# Altium footprint library Module.PcbLib: 63 footprints (part 4 of 4)
Each footprint in its own frame and in the unit in brackets; x right, y up, seen from the top. Pads: shape width x height; smd on the part's side, far side on the other; paste and mask are expansions set on the pad; w line width, h text height; cw(c..) or ccw(c..) is an arc to the next point about the centre after c.
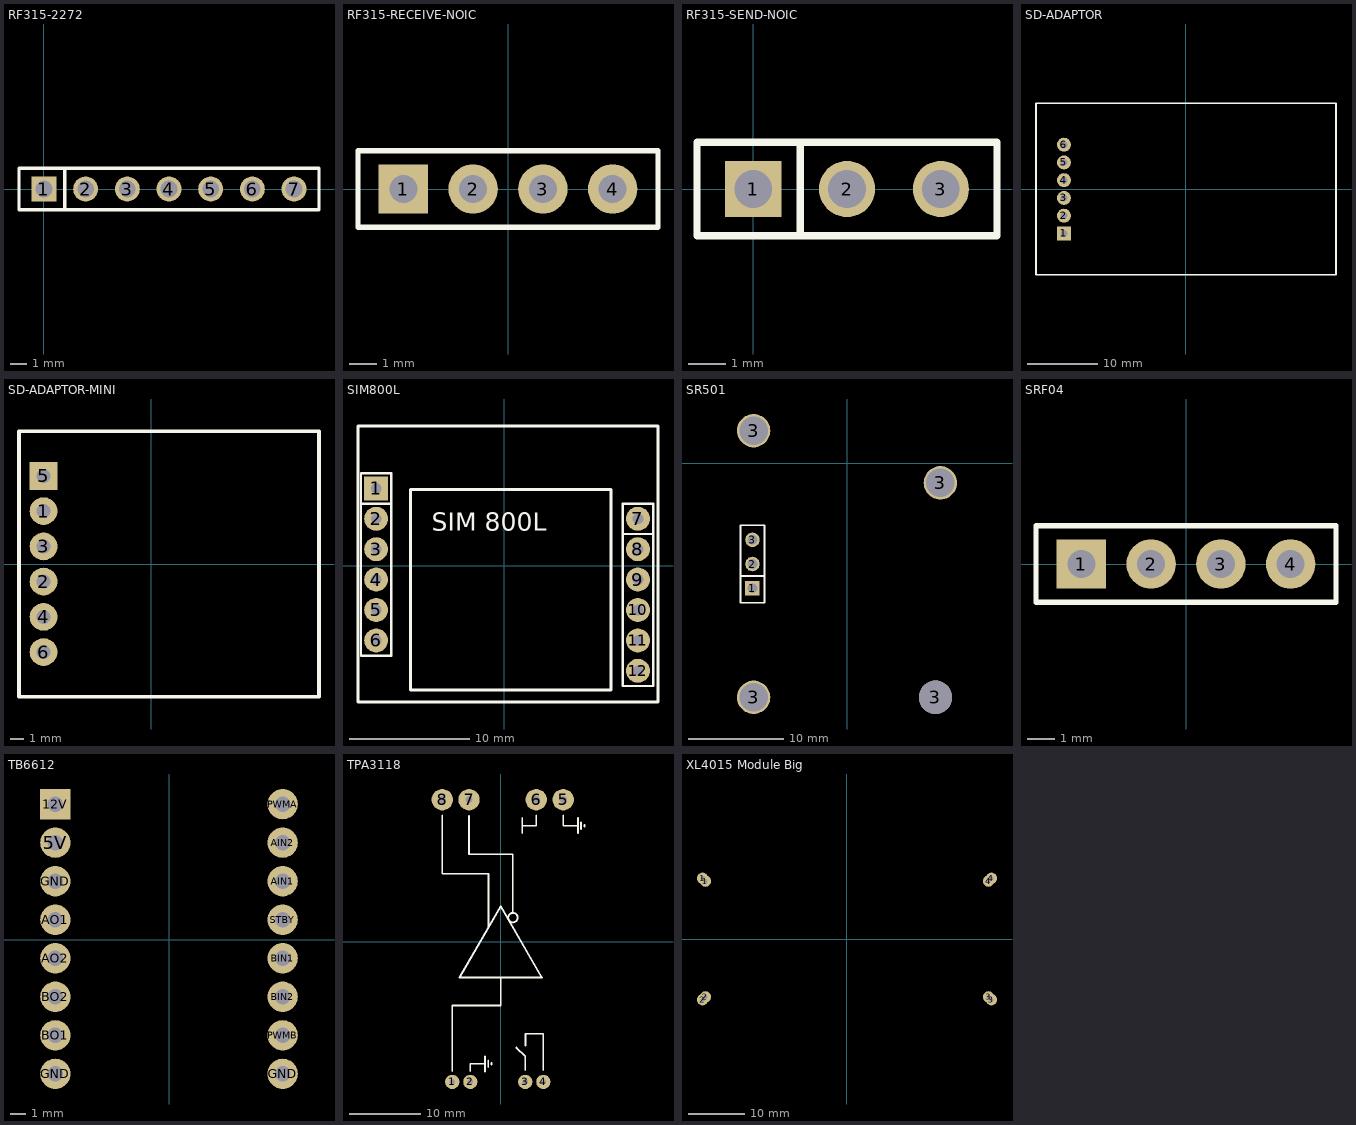
[diagram p3: the footprints below, top view; thin cyan lines are the x and y axes]

## RF315-2272 [mm]
height 8.5
pads (7):
  rect 1.52x1.52 hole 1.02: 1(0,0)
  round 1.52 hole 1.02: 2(2.54,0) 3(5.08,0) 4(7.62,0) 5(10.16,0) 6(12.7,0) 7(15.24,0)
Top Overlay:
  lines w0.2: 1.27,-1.27 1.27,1.27 ; -1.52,-1.27 -1.52,1.27 16.76,1.27 16.76,-1.27 -1.52,-1.27
3D body "61300711821.stp": height 8.51, standoff -3.09, extent -1.52,-1.25 16.76,1.25
3D body "User Library-XY_DJM_5V_RECEPTOR.STEP": height 30.31, standoff 2.31, extent -24.363,-1.468 16.637,5.532

## RF315-RECEIVE-NOIC [mm]
height 8.5
pads (4):
  rect 1.8x1.8 hole 1.02: 1(-3.81,0)
  round 1.8 hole 1.02: 2(-1.27,0) 3(1.27,0) 4(3.81,0)
Top Overlay:
  lines w0.2: -5.461,-1.397 5.461,-1.397 5.461,1.397 -5.461,1.397 -5.461,-1.397
3D body "61300411821.stp": height 8.51, standoff -3.09, extent -5.33,-1.25 5.33,1.25
3D body "User Library-XD-RF-5V.STEP": height 21.75, standoff 2.75, extent -22.366,-1.524 7.634,6.476

## RF315-SEND-NOIC [mm]
height 8.5
pads (3):
  rect 1.52x1.52 hole 1.02: 1(0,0)
  round 1.52 hole 1.02: 2(2.54,0) 3(5.08,0)
Top Overlay:
  lines w0.2: 1.27,-1.27 1.27,1.27 ; -1.524,-1.27 6.6,-1.27 6.6,1.27 -1.524,1.27 -1.524,-1.27
3D body "61300311821.stp": height 8.51, standoff -3.09, extent -1.52,-1.25 6.6,1.25
3D body "User Library-XD-FST.STEP": height 27.22, standoff 2.32, extent -7.468,-1.526 11.532,6.604

## rn4020 [mm]
height 8.5
3D body "RN4020.step": height 0.01, standoff -2.3, extent -9.271,-5.911 10.234,5.595

## SD-ADAPTOR [mm]
pads (6):
  rect 2x2 hole 1.02: 1(-17.468,-6.359)
  round 2 hole 1.02: 2(-17.468,-3.819) 3(-17.468,-1.279) 4(-17.468,1.261) 5(-17.468,3.801) 6(-17.468,6.341)
Top Overlay:
  lines w0.254: -21.467,-12.273 21.468,-12.273 21.468,12.273 -21.467,12.273 -21.467,-12.273
3D body "61300611121.stp": height 8.54, standoff -3, extent -18.738,-7.629 -16.198,7.611
3D body "MicroSD Card Module - 2.stp": height 7.38, standoff 3.97, extent -20.968,-11.773 20.968,11.773

## SD-ADAPTOR-MINI [mm]
pads (6):
  round 2 hole 1.02: 1(-7.772,3.81) 2(-7.772,-1.27) 3(-7.772,1.27) 4(-7.772,-3.81) 6(-7.772,-6.35)
  rect 2x2 hole 1.02: 5(-7.772,6.35)
Top Overlay:
  lines w0.254: -9.543,-9.555 12.083,-9.555 12.083,9.555 -9.543,9.555 -9.543,-9.555
3D body "MicroSD Card Module - 1.stp": height 6.38, standoff 2.97, extent -9.042,-9.055 11.582,9.055
3D body "61300611121.stp": height 8.54, standoff -3, extent -9.042,-7.62 -6.502,7.62

## SD-CARD [mm]
3D body "SD Card Module - 1.stp": height 2.8, standoff -1.57, extent 21.171,-45.276 51.016,6.337
3D body "SD Card readerwriter.stp": height 10.17, standoff -1, extent -11.553,-51.62 18.847,8.28

## SIM800L [mm]
pads (14):
  rect 2x2 hole 0.9: 1(-10.719,6.477)
  round 2 hole 0.9: 2(-10.719,3.937) 3(-10.719,1.397) 4(-10.719,-1.143) 5(-10.719,-3.683) 6(-10.719,-6.223) 7(11.151,3.937) 8(11.151,1.397) 9(11.151,-1.143) 10(11.151,-3.683) 11(11.151,-6.223) 12(11.151,-8.763) ""(-10.719,6.477) ""(11.151,3.937)
Top Overlay:
  lines w0.2: -11.989,5.207 -9.449,5.207 ; 9.881,2.667 12.421,2.667 ; -11.989,-7.493 -9.449,-7.493 -9.449,7.747 -11.989,7.747 -11.989,-7.493 ; 9.881,-10.033 12.421,-10.033 12.421,5.207 9.881,5.207 9.881,-10.033
  lines w0.254: -12.237,-11.354 12.827,-11.354 12.827,11.673 -12.237,11.673 -12.237,-11.354 ; -7.849,-10.363 8.89,-10.363 8.89,6.376 -7.849,6.376 -7.849,-10.363
  text "SIM 800L" at -6.096,2.921 h1.52
3D body "User Library-module_sim800l.STEP": height 8.1, standoff -4.4, extent -12.231,-11.465 12.769,11.669

## SR501 [mm]
height 8.5
pads (7):
  rect 1.52x1.52 hole 1.02: 1(-9.906,-13.081)
  round 1.52 hole 1.02: 2(-9.906,-10.541) 3(-9.906,-8.001)
  round 3.5 hole 3: 3(-9.779,-24.511) 3(-9.779,3.429) 3(9.779,-2.032)
  round 3.5 hole 3.5: 3(9.271,-24.511)
Top Overlay:
  lines w0.2: -11.176,-11.811 -8.636,-11.811 ; -11.176,-14.601 -8.636,-14.601 -8.636,-6.481 -11.176,-6.481 -11.176,-14.601
3D body "61300311821.stp": height 8.51, standoff -3.09, extent -11.156,-14.601 -8.656,-6.481
3D body "sensor board.STEP": height 15, standoff 0, extent -12.254,-26.541 12.746,5.459
3D body "lens.SLDPRT": height 23.5, standoff 4, extent -12.189,-22.541 11.811,1.459

## SRF04 [mm]
height 8.5
pads (4):
  rect 1.8x1.8 hole 1.02: 1(-3.81,0)
  round 1.8 hole 1.02: 2(-1.27,0) 3(1.27,0) 4(3.81,0)
Top Overlay:
  lines w0.2: -5.461,-1.397 5.461,-1.397 5.461,1.397 -5.461,1.397 -5.461,-1.397
3D body "61300411821.stp": height 8.51, standoff -3.09, extent -5.33,-1.25 5.33,1.25
3D body "User Library-HC-SR04.STEP": height 28.5, standoff 3.32, extent -22.246,-0.254 22.754,17.814

## TB6612 [mm]
pads (16):
  round 2 hole 1.02: 5V(-7.493,6.401) AIN1(7.493,3.861) AIN2(7.493,6.401) AO1(-7.493,1.321) AO2(-7.493,-1.219) BIN1(7.493,-1.219) BIN2(7.493,-3.759) BO1(-7.493,-6.299) BO2(-7.493,-3.759) GND(-7.493,-8.839) GND(-7.493,3.861) GND(7.493,-8.839) PWMA(7.493,8.941) PWMB(7.493,-6.299) STBY(7.493,1.321)
  rect 2x2 hole 1.02: 12V(-7.493,8.941)
3D body "User Library-Motor Driver.step": height -0.97, standoff -4.54, extent -10.452,-10.49 10.452,10.49

## tcrt 5000 [mm]
height 8.5
3D body "User Library-TCRT-5000.STEP": height 6.5, standoff -25.41, extent -4.987,-3.027 5.313,2.773

## TEMP [mm]

## TPA3118 [mm] "Module Mono 60W"
pads (8):
  round 2 hole 0.8: 1(-6.807,-19.685) 2(-4.267,-19.685) 3(3.46,-19.685) 4(6,-19.685)
  round 3 hole 1: 5(8.797,19.99) 6(4.997,19.99) 7(-4.445,19.99) 8(-8.204,19.99)
Top Overlay:
  circle w0.254: c1.727,3.404 r0.662
  lines w0.254: -8.204,17.755 -8.204,9.576 -1.704,9.576 -1.704,2.057 ; -6.807,-18.161 -6.807,-8.941 0,-8.941 0,-5 ; -4.445,17.729 -4.445,12.319 1.704,12.319 1.704,4.064 ; -4.267,-18.161 -4.267,-17.145 -2.21,-17.145 ; -2.21,-18.212 -2.21,-17.145 ; -2.21,-16.078 -2.21,-17.145 ; -1.753,-17.602 -1.753,-17.145 -1.753,-16.688 ; -1.295,-17.259 -1.295,-17.145 -1.295,-17.031 ; 2.21,-14.859 3.46,-16.109 3.46,-18.034 ; 3.023,15.265 3.023,16.332 ; 3.023,17.399 3.023,16.332 ; 3.48,-14.554 3.48,-12.929 6,-12.929 6,-18.034 ; 4.997,17.755 4.997,16.332 3.023,16.332 ; 8.797,17.755 8.797,16.332 10.854,16.332 ; 10.854,15.265 10.854,16.332 ; 10.854,17.399 10.854,16.332 ; 11.311,15.875 11.311,16.332 11.311,16.789 ; 11.769,16.218 11.769,16.332 11.769,16.447 ; 0,-5 5.791,-5 0,5 -5.791,-5 0,-5
3D body "kicad_module_3D_TPA3118__.step": height 11.65, standoff 0, extent -18,-23.1 17.8,23.5

## XL4015 Module Big [mm]
pads (8):
  round 2 hole 0.762: 1(-25.527,10.787) 1(-25.027,10.287) 2(-25.527,-10.719) 2(-25.027,-10.219) 3(25.103,-10.218) 3(25.603,-10.719) 4(25.103,10.287) 4(25.603,10.787)
3D body "XL4015_MODELO_PISTAS.step": height 14.53, standoff -0.23, extent -26.942,-11.987 27.058,12.027